# Altium footprint library Molex FFC - FPC Connectors (SMT).PcbLib: 638 footprints (part 8 of 40)
Each footprint in its own frame and in the unit in brackets; x right, y up, seen from the top. Pads: shape width x height; smd on the part's side, far side on the other; paste and mask are expansions set on the pad; w line width, h text height; cw(c..) or ccw(c..) is an arc to the next point about the centre after c.
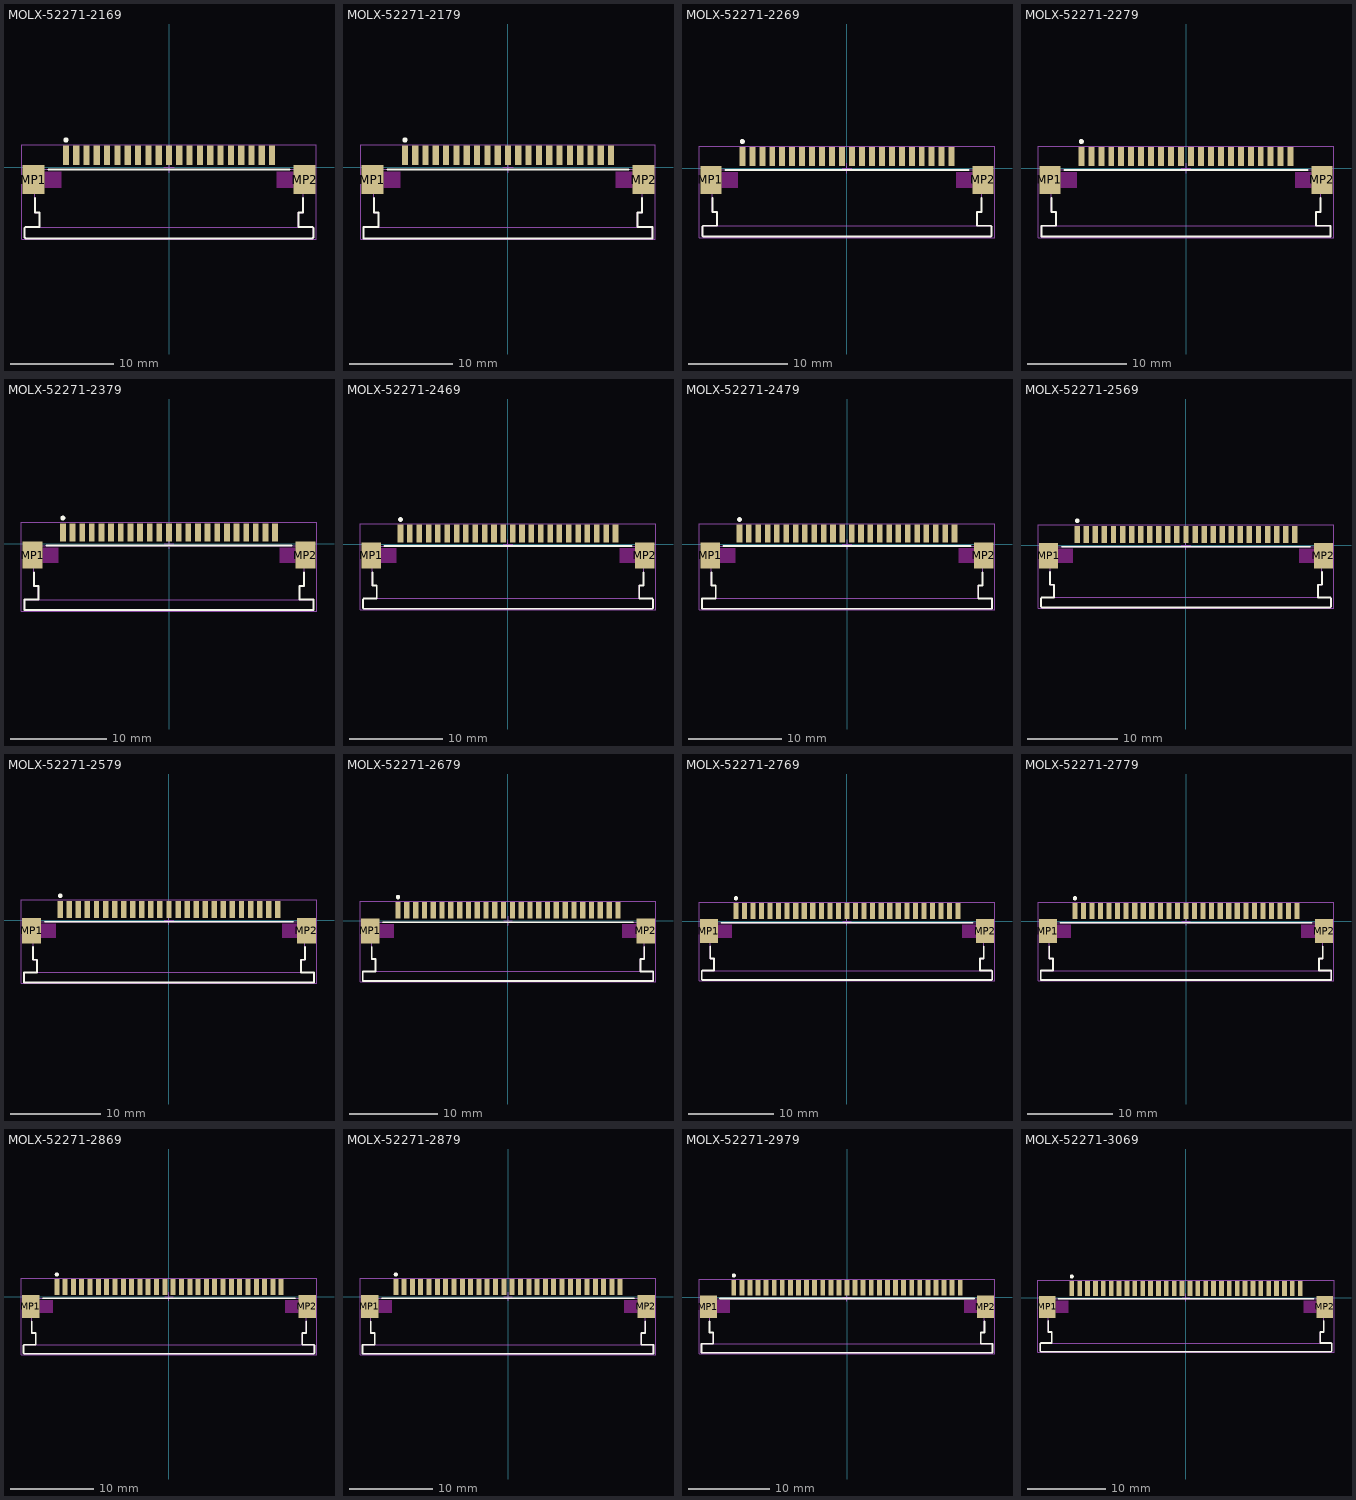
[diagram p7: the footprints below, top view; thin cyan lines are the x and y axes]

## MOLX-52271-2169 [mm] "FPC Connector, 21-Leads, Right Angle, Pitch 1.0 mm, Mated Height 3.0 mm, SMT"
height 3.012
pads (23):
  rect 0.6x1.9 smd: 1(-10,1.175) 2(-9,1.175) 3(-8,1.175) 4(-7,1.175) 5(-6,1.175) 6(-5,1.175) 7(-4,1.175) 8(-3,1.175) 9(-2,1.175) 10(-1,1.175) 11(0,1.175) 12(1,1.175) 13(2,1.175) 14(3,1.175) 15(4,1.175) 16(5,1.175) 17(6,1.175) 18(7,1.175) 19(8,1.175) 20(9,1.175) 21(10,1.175)
  rect 2.1x2.8 smd: MP1(-13.15,-1.175) MP2(13.15,-1.175)
Top Overlay:
  circle w0.25: c-10,2.675 r0.125
  lines w0.2: -13,-2.975 -13,-4.375 -12.55,-4.375 -12.55,-5.775 -13.912,-5.775 -14,-5.863 -14,-6.787 -13.912,-6.875 13.912,-6.875 14,-6.787 14,-5.863 13.912,-5.775 12.55,-5.775 12.55,-4.375 13,-4.375 13,-2.975 ; -11.7,-0.175 11.7,-0.175
Keep-Out Layer:
  rectangle: -12.1,-1.975 -10.45,-0.375
  rectangle: 10.45,-1.975 12.1,-0.375
Mechanical 13:
  lines w0.1: -12.55,-5.775 -12.55,-4.375 -13,-4.375 -13,-0.175 13,-0.175 13,-4.375 12.55,-4.375 12.55,-5.775 ; -14,-6.787 -14,-5.863 -13.912,-5.775 13.912,-5.775 14,-5.863 14,-6.787 13.912,-6.875 -13.912,-6.875 -14,-6.787
Mechanical 15:
  lines w0.05: -14.3,-6.975 14.3,-6.975 14.3,2.225 -14.3,2.225 -14.3,-6.975
  lines w0.1: -0.5,0 0.5,0 ; 0,-0.5 0,0.5
3D body: height 0.25, standoff 0, extent -14,-6.875 14,1.825

## MOLX-52271-2179 [mm] "FPC Connector, 21-Leads, Right Angle, Pitch 1.0 mm, Mated Height 3.0 mm, SMT"
height 3.012
pads (23):
  rect 0.6x1.9 smd: 1(-10,1.175) 2(-9,1.175) 3(-8,1.175) 4(-7,1.175) 5(-6,1.175) 6(-5,1.175) 7(-4,1.175) 8(-3,1.175) 9(-2,1.175) 10(-1,1.175) 11(0,1.175) 12(1,1.175) 13(2,1.175) 14(3,1.175) 15(4,1.175) 16(5,1.175) 17(6,1.175) 18(7,1.175) 19(8,1.175) 20(9,1.175) 21(10,1.175)
  rect 2.1x2.8 smd: MP1(-13.15,-1.175) MP2(13.15,-1.175)
Top Overlay:
  circle w0.25: c-10,2.675 r0.125
  lines w0.2: -13,-2.975 -13,-4.375 -12.55,-4.375 -12.55,-5.775 -14,-5.775 -14,-6.875 14,-6.875 14,-5.775 12.55,-5.775 12.55,-4.375 13,-4.375 13,-2.975 ; -11.7,-0.175 11.7,-0.175
Keep-Out Layer:
  rectangle: 10.45,-1.975 12.1,-0.375
  region: -10.45,-0.375 -12.1,-0.375 -12.1,-1.975 -10.45,-1.975
Mechanical 13:
  lines w0.1: -12.55,-5.775 -12.55,-4.375 -13,-4.375 -13,-0.175 13,-0.175 13,-4.375 12.55,-4.375 12.55,-5.775 ; -14,-6.875 -14,-5.775 14,-5.775 14,-6.875 -14,-6.875
Mechanical 15:
  lines w0.05: -14.3,-6.975 14.3,-6.975 14.3,2.225 -14.3,2.225 -14.3,-6.975
  lines w0.1: -0.5,0 0.5,0 ; 0,-0.5 0,0.5
3D body: height 0.25, standoff 0, extent -14,-6.875 14,1.825

## MOLX-52271-2269 [mm] "FPC Connector, 22-Leads, Right Angle, Pitch 1.0 mm, Mated Height 3.0 mm, SMT"
height 3.012
pads (24):
  rect 0.6x1.9 smd: 1(-10.5,1.175) 2(-9.5,1.175) 3(-8.5,1.175) 4(-7.5,1.175) 5(-6.5,1.175) 6(-5.5,1.175) 7(-4.5,1.175) 8(-3.5,1.175) 9(-2.5,1.175) 10(-1.5,1.175) 11(-0.5,1.175) 12(0.5,1.175) 13(1.5,1.175) 14(2.5,1.175) 15(3.5,1.175) 16(4.5,1.175) 17(5.5,1.175) 18(6.5,1.175) 19(7.5,1.175) 20(8.5,1.175) 21(9.5,1.175) 22(10.5,1.175)
  rect 2.1x2.8 smd: MP1(-13.65,-1.175) MP2(13.65,-1.175)
Top Overlay:
  circle w0.25: c-10.5,2.675 r0.125
  lines w0.2: -13.5,-2.975 -13.5,-4.375 -13.05,-4.375 -13.05,-5.775 -14.412,-5.775 -14.5,-5.863 -14.5,-6.787 -14.412,-6.875 14.412,-6.875 14.5,-6.787 14.5,-5.863 14.412,-5.775 13.05,-5.775 13.05,-4.375 13.5,-4.375 13.5,-2.975 ; -12.2,-0.175 12.2,-0.175
Keep-Out Layer:
  rectangle: -12.6,-1.975 -10.95,-0.375
  rectangle: 10.95,-1.975 12.6,-0.375
Mechanical 13:
  lines w0.1: -13.05,-5.775 -13.05,-4.375 -13.5,-4.375 -13.5,-0.175 13.5,-0.175 13.5,-4.375 13.05,-4.375 13.05,-5.775 ; -14.5,-6.787 -14.5,-5.863 -14.412,-5.775 14.412,-5.775 14.5,-5.863 14.5,-6.787 14.412,-6.875 -14.412,-6.875 -14.5,-6.787
Mechanical 15:
  lines w0.05: -14.8,-6.975 14.8,-6.975 14.8,2.225 -14.8,2.225 -14.8,-6.975
  lines w0.1: -0.5,0 0.5,0 ; 0,-0.5 0,0.5
3D body: height 0.25, standoff 0, extent -14.5,-6.875 14.5,1.825

## MOLX-52271-2279 [mm] "FPC Connector, 22-Leads, Right Angle, Pitch 1.0 mm, Mated Height 3.0 mm, SMT"
height 3.012
pads (24):
  rect 0.6x1.9 smd: 1(-10.5,1.175) 2(-9.5,1.175) 3(-8.5,1.175) 4(-7.5,1.175) 5(-6.5,1.175) 6(-5.5,1.175) 7(-4.5,1.175) 8(-3.5,1.175) 9(-2.5,1.175) 10(-1.5,1.175) 11(-0.5,1.175) 12(0.5,1.175) 13(1.5,1.175) 14(2.5,1.175) 15(3.5,1.175) 16(4.5,1.175) 17(5.5,1.175) 18(6.5,1.175) 19(7.5,1.175) 20(8.5,1.175) 21(9.5,1.175) 22(10.5,1.175)
  rect 2.1x2.8 smd: MP1(-13.65,-1.175) MP2(13.65,-1.175)
Top Overlay:
  circle w0.25: c-10.5,2.675 r0.125
  lines w0.2: -13.5,-2.975 -13.5,-4.375 -13.05,-4.375 -13.05,-5.775 -14.5,-5.775 -14.5,-6.875 14.5,-6.875 14.5,-5.775 13.05,-5.775 13.05,-4.375 13.5,-4.375 13.5,-2.975 ; -12.2,-0.175 12.2,-0.175
Keep-Out Layer:
  region: -10.95,-0.375 -12.6,-0.375 -12.6,-1.975 -10.95,-1.975
  rectangle: 10.95,-1.975 12.6,-0.375
Mechanical 13:
  lines w0.1: -13.05,-5.775 -13.05,-4.375 -13.5,-4.375 -13.5,-0.175 13.5,-0.175 13.5,-4.375 13.05,-4.375 13.05,-5.775 ; -14.5,-6.875 14.5,-6.875 14.5,-5.775 -14.5,-5.775 -14.5,-6.875
Mechanical 15:
  lines w0.05: -14.8,-6.975 -14.8,2.225 14.8,2.225 14.8,-6.975 -14.8,-6.975
  lines w0.1: -0.5,0 0.5,0 ; 0,-0.5 0,0.5
3D body: height 0.25, standoff 0, extent -14.5,-6.875 14.5,1.825

## MOLX-52271-2379 [mm] "FPC Connector, 23-Leads, Right Angle, Pitch 1.0 mm, Mated Height 3.0 mm, SMT"
height 3.012
pads (25):
  rect 0.6x1.9 smd: 1(-11,1.175) 2(-10,1.175) 3(-9,1.175) 4(-8,1.175) 5(-7,1.175) 6(-6,1.175) 7(-5,1.175) 8(-4,1.175) 9(-3,1.175) 10(-2,1.175) 11(-1,1.175) 12(0,1.175) 13(1,1.175) 14(2,1.175) 15(3,1.175) 16(4,1.175) 17(5,1.175) 18(6,1.175) 19(7,1.175) 20(8,1.175) 21(9,1.175) 22(10,1.175) 23(11,1.175)
  rect 2.1x2.8 smd: MP1(-14.15,-1.175) MP2(14.15,-1.175)
Top Overlay:
  circle w0.25: c-11,2.675 r0.125
  lines w0.2: -14,-2.975 -14,-4.375 -13.55,-4.375 -13.55,-5.775 -15,-5.775 -15,-6.875 15,-6.875 15,-5.775 13.55,-5.775 13.55,-4.375 14,-4.375 14,-2.975 ; -12.7,-0.175 12.7,-0.175
Keep-Out Layer:
  region: -11.45,-0.375 -13.1,-0.375 -13.1,-1.975 -11.45,-1.975
  rectangle: 11.45,-1.975 13.1,-0.375
Mechanical 13:
  lines w0.1: -13.55,-5.775 -13.55,-4.375 -14,-4.375 -14,-0.175 14,-0.175 14,-4.375 13.55,-4.375 13.55,-5.775 ; -15,-6.875 15,-6.875 15,-5.775 -15,-5.775 -15,-6.875
Mechanical 15:
  lines w0.05: -15.3,-6.975 -15.3,2.225 15.3,2.225 15.3,-6.975 -15.3,-6.975
  lines w0.1: -0.5,0 0.5,0 ; 0,-0.5 0,0.5
3D body: height 0.25, standoff 0, extent -15,-6.875 15,1.825

## MOLX-52271-2469 [mm] "FPC Connector, 24-Leads, Right Angle, Pitch 1.0 mm, Mated Height 3.0 mm, SMT"
height 3.012
pads (26):
  rect 0.6x1.9 smd: 1(-11.5,1.175) 2(-10.5,1.175) 3(-9.5,1.175) 4(-8.5,1.175) 5(-7.5,1.175) 6(-6.5,1.175) 7(-5.5,1.175) 8(-4.5,1.175) 9(-3.5,1.175) 10(-2.5,1.175) 11(-1.5,1.175) 12(-0.5,1.175) 13(0.5,1.175) 14(1.5,1.175) 15(2.5,1.175) 16(3.5,1.175) 17(4.5,1.175) 18(5.5,1.175) 19(6.5,1.175) 20(7.5,1.175) 21(8.5,1.175) 22(9.5,1.175) 23(10.5,1.175) 24(11.5,1.175)
  rect 2.1x2.8 smd: MP1(-14.65,-1.175) MP2(14.65,-1.175)
Top Overlay:
  circle w0.25: c-11.5,2.675 r0.125
  lines w0.2: -14.5,-2.975 -14.5,-4.375 -14.05,-4.375 -14.05,-5.775 -15.412,-5.775 -15.5,-5.863 -15.5,-6.787 -15.412,-6.875 15.412,-6.875 15.5,-6.787 15.5,-5.863 15.412,-5.775 14.05,-5.775 14.05,-4.375 14.5,-4.375 14.5,-2.975 ; -13.2,-0.175 13.2,-0.175
Keep-Out Layer:
  rectangle: 11.95,-1.975 13.6,-0.375
  rectangle: -13.6,-1.975 -11.95,-0.375
Mechanical 13:
  lines w0.1: -14.05,-5.775 -14.05,-4.375 -14.5,-4.375 -14.5,-0.175 14.5,-0.175 14.5,-4.375 14.05,-4.375 14.05,-5.775 ; -15.5,-6.787 -15.412,-6.875 15.412,-6.875 15.5,-6.787 15.5,-5.863 15.412,-5.775 -15.412,-5.775 -15.5,-5.863 -15.5,-6.787
Mechanical 15:
  lines w0.05: -15.8,-6.975 -15.8,2.225 15.8,2.225 15.8,-6.975 -15.8,-6.975
  lines w0.1: -0.5,0 0.5,0 ; 0,-0.5 0,0.5
3D body: height 0.25, standoff 0, extent -15.5,-6.875 15.5,1.825

## MOLX-52271-2479 [mm] "FPC Connector, 24-Leads, Right Angle, Pitch 1.0 mm, Mated Height 3.0 mm, SMT"
height 3.012
pads (26):
  rect 0.6x1.9 smd: 1(-11.5,1.175) 2(-10.5,1.175) 3(-9.5,1.175) 4(-8.5,1.175) 5(-7.5,1.175) 6(-6.5,1.175) 7(-5.5,1.175) 8(-4.5,1.175) 9(-3.5,1.175) 10(-2.5,1.175) 11(-1.5,1.175) 12(-0.5,1.175) 13(0.5,1.175) 14(1.5,1.175) 15(2.5,1.175) 16(3.5,1.175) 17(4.5,1.175) 18(5.5,1.175) 19(6.5,1.175) 20(7.5,1.175) 21(8.5,1.175) 22(9.5,1.175) 23(10.5,1.175) 24(11.5,1.175)
  rect 2.1x2.8 smd: MP1(-14.65,-1.175) MP2(14.65,-1.175)
Top Overlay:
  circle w0.25: c-11.5,2.675 r0.125
  lines w0.2: -14.5,-2.975 -14.5,-4.375 -14.05,-4.375 -14.05,-5.775 -15.5,-5.775 -15.5,-6.875 15.5,-6.875 15.5,-5.775 14.05,-5.775 14.05,-4.375 14.5,-4.375 14.5,-2.975 ; -13.2,-0.175 13.2,-0.175
Keep-Out Layer:
  region: -11.95,-0.375 -13.6,-0.375 -13.6,-1.975 -11.95,-1.975
  rectangle: 11.95,-1.975 13.6,-0.375
Mechanical 13:
  lines w0.1: -14.05,-5.775 -14.05,-4.375 -14.5,-4.375 -14.5,-0.175 14.5,-0.175 14.5,-4.375 14.05,-4.375 14.05,-5.775 ; -15.5,-6.875 15.5,-6.875 15.5,-5.775 -15.5,-5.775 -15.5,-6.875
Mechanical 15:
  lines w0.05: -15.8,-6.975 -15.8,2.225 15.8,2.225 15.8,-6.975 -15.8,-6.975
  lines w0.1: -0.5,0 0.5,0 ; 0,-0.5 0,0.5
3D body: height 0.25, standoff 0, extent -15.5,-6.875 15.5,1.825

## MOLX-52271-2569 [mm] "FPC Connector, 25-Leads, Right Angle, Pitch 1.0 mm, Mated Height 3.0 mm, SMT"
height 3.012
pads (27):
  rect 0.6x1.9 smd: 1(-12,1.175) 2(-11,1.175) 3(-10,1.175) 4(-9,1.175) 5(-8,1.175) 6(-7,1.175) 7(-6,1.175) 8(-5,1.175) 9(-4,1.175) 10(-3,1.175) 11(-2,1.175) 12(-1,1.175) 13(0,1.175) 14(1,1.175) 15(2,1.175) 16(3,1.175) 17(4,1.175) 18(5,1.175) 19(6,1.175) 20(7,1.175) 21(8,1.175) 22(9,1.175) 23(10,1.175) 24(11,1.175) 25(12,1.175)
  rect 2.1x2.8 smd: MP1(-15.15,-1.175) MP2(15.15,-1.175)
Top Overlay:
  circle w0.25: c-12,2.675 r0.125
  lines w0.2: -15,-2.975 -15,-4.375 -14.55,-4.375 -14.55,-5.775 -15.912,-5.775 -16,-5.863 -16,-6.787 -15.912,-6.875 15.912,-6.875 16,-6.787 16,-5.863 15.912,-5.775 14.55,-5.775 14.55,-4.375 15,-4.375 15,-2.975 ; -13.7,-0.175 13.7,-0.175
Keep-Out Layer:
  rectangle: -14.1,-1.975 -12.45,-0.375
  rectangle: 12.45,-1.975 14.1,-0.375
Mechanical 13:
  lines w0.1: -14.55,-5.775 -14.55,-4.375 -15,-4.375 -15,-0.175 15,-0.175 15,-4.375 14.55,-4.375 14.55,-5.775 ; -16,-6.787 -16,-5.863 -15.912,-5.775 15.912,-5.775 16,-5.863 16,-6.787 15.912,-6.875 -15.912,-6.875 -16,-6.787
Mechanical 15:
  lines w0.05: -16.3,-6.975 16.3,-6.975 16.3,2.225 -16.3,2.225 -16.3,-6.975
  lines w0.1: -0.5,0 0.5,0 ; 0,-0.5 0,0.5
3D body: height 0.25, standoff 0, extent -16,-6.875 16,1.825

## MOLX-52271-2579 [mm] "FPC Connector, 25-Leads, Right Angle, Pitch 1.0 mm, Mated Height 3.0 mm, SMT"
height 3.012
pads (27):
  rect 0.6x1.9 smd: 1(-12,1.175) 2(-11,1.175) 3(-10,1.175) 4(-9,1.175) 5(-8,1.175) 6(-7,1.175) 7(-6,1.175) 8(-5,1.175) 9(-4,1.175) 10(-3,1.175) 11(-2,1.175) 12(-1,1.175) 13(0,1.175) 14(1,1.175) 15(2,1.175) 16(3,1.175) 17(4,1.175) 18(5,1.175) 19(6,1.175) 20(7,1.175) 21(8,1.175) 22(9,1.175) 23(10,1.175) 24(11,1.175) 25(12,1.175)
  rect 2.1x2.8 smd: MP1(-15.15,-1.175) MP2(15.15,-1.175)
Top Overlay:
  circle w0.25: c-12,2.675 r0.125
  lines w0.2: -15,-2.975 -15,-4.375 -14.55,-4.375 -14.55,-5.775 -16,-5.775 -16,-6.875 16,-6.875 16,-5.775 14.55,-5.775 14.55,-4.375 15,-4.375 15,-2.975 ; -13.7,-0.175 13.7,-0.175
Keep-Out Layer:
  region: -12.45,-0.375 -14.1,-0.375 -14.1,-1.975 -12.45,-1.975
  rectangle: 12.45,-1.975 14.1,-0.375
Mechanical 13:
  lines w0.1: -14.55,-5.775 -14.55,-4.375 -15,-4.375 -15,-0.175 15,-0.175 15,-4.375 14.55,-4.375 14.55,-5.775 ; -16,-6.875 16,-6.875 16,-5.775 -16,-5.775 -16,-6.875
Mechanical 15:
  lines w0.05: -16.3,-6.975 -16.3,2.225 16.3,2.225 16.3,-6.975 -16.3,-6.975
  lines w0.1: -0.5,0 0.5,0 ; 0,-0.5 0,0.5
3D body: height 0.25, standoff 0, extent -16,-6.875 16,1.825

## MOLX-52271-2679 [mm] "FPC Connector, 26-Leads, Right Angle, Pitch 1.0 mm, Mated Height 3.0 mm, SMT"
height 3.012
pads (28):
  rect 0.6x1.9 smd: 1(-12.5,1.175) 2(-11.5,1.175) 3(-10.5,1.175) 4(-9.5,1.175) 5(-8.5,1.175) 6(-7.5,1.175) 7(-6.5,1.175) 8(-5.5,1.175) 9(-4.5,1.175) 10(-3.5,1.175) 11(-2.5,1.175) 12(-1.5,1.175) 13(-0.5,1.175) 14(0.5,1.175) 15(1.5,1.175) 16(2.5,1.175) 17(3.5,1.175) 18(4.5,1.175) 19(5.5,1.175) 20(6.5,1.175) 21(7.5,1.175) 22(8.5,1.175) 23(9.5,1.175) 24(10.5,1.175) 25(11.5,1.175) 26(12.5,1.175)
  rect 2.1x2.8 smd: MP1(-15.65,-1.175) MP2(15.65,-1.175)
Top Overlay:
  circle w0.25: c-12.5,2.675 r0.125
  lines w0.2: -15.5,-2.975 -15.5,-4.375 -15.05,-4.375 -15.05,-5.775 -16.5,-5.775 -16.5,-6.875 16.5,-6.875 16.5,-5.775 15.05,-5.775 15.05,-4.375 15.5,-4.375 15.5,-2.975 ; -14.2,-0.175 14.2,-0.175
Keep-Out Layer:
  region: -12.95,-0.375 -14.6,-0.375 -14.6,-1.975 -12.95,-1.975
  rectangle: 12.95,-1.975 14.6,-0.375
Mechanical 13:
  lines w0.1: -15.05,-5.775 -15.05,-4.375 -15.5,-4.375 -15.5,-0.175 15.5,-0.175 15.5,-4.375 15.05,-4.375 15.05,-5.775 ; -16.5,-6.875 -16.5,-5.775 16.5,-5.775 16.5,-6.875 -16.5,-6.875
Mechanical 15:
  lines w0.05: -16.8,-6.975 16.8,-6.975 16.8,2.225 -16.8,2.225 -16.8,-6.975
  lines w0.1: -0.5,0 0.5,0 ; 0,-0.5 0,0.5
3D body: height 0.25, standoff 0, extent -16.5,-6.875 16.5,1.825

## MOLX-52271-2769 [mm] "FPC Connector, 27-Leads, Right Angle, Pitch 1.0 mm, Mated Height 3.0 mm, SMT"
height 3.012
pads (29):
  rect 0.6x1.9 smd: 1(-13,1.175) 2(-12,1.175) 3(-11,1.175) 4(-10,1.175) 5(-9,1.175) 6(-8,1.175) 7(-7,1.175) 8(-6,1.175) 9(-5,1.175) 10(-4,1.175) 11(-3,1.175) 12(-2,1.175) 13(-1,1.175) 14(0,1.175) 15(1,1.175) 16(2,1.175) 17(3,1.175) 18(4,1.175) 19(5,1.175) 20(6,1.175) 21(7,1.175) 22(8,1.175) 23(9,1.175) 24(10,1.175) 25(11,1.175) 26(12,1.175) 27(13,1.175)
  rect 2.1x2.8 smd: MP1(-16.15,-1.175) MP2(16.15,-1.175)
Top Overlay:
  circle w0.25: c-13,2.675 r0.125
  lines w0.2: -16,-2.975 -16,-4.375 -15.55,-4.375 -15.55,-5.775 -16.912,-5.775 -17,-5.863 -17,-6.787 -16.912,-6.875 16.912,-6.875 17,-6.787 17,-5.863 16.912,-5.775 15.55,-5.775 15.55,-4.375 16,-4.375 16,-2.975 ; -14.7,-0.175 14.7,-0.175
Keep-Out Layer:
  rectangle: -15.1,-1.975 -13.45,-0.375
  rectangle: 13.45,-1.975 15.1,-0.375
Mechanical 13:
  lines w0.1: -15.55,-5.775 -15.55,-4.375 -16,-4.375 -16,-0.175 16,-0.175 16,-4.375 15.55,-4.375 15.55,-5.775 ; -17,-6.787 -17,-5.863 -16.912,-5.775 16.912,-5.775 17,-5.863 17,-6.787 16.912,-6.875 -16.912,-6.875 -17,-6.787
Mechanical 15:
  lines w0.05: -17.3,-6.975 17.3,-6.975 17.3,2.225 -17.3,2.225 -17.3,-6.975
  lines w0.1: -0.5,0 0.5,0 ; 0,-0.5 0,0.5
3D body: height 0.25, standoff 0, extent -17,-6.875 17,1.825

## MOLX-52271-2779 [mm] "FPC Connector, 27-Leads, Right Angle, Pitch 1.0 mm, Mated Height 3.0 mm, SMT"
height 3.012
pads (29):
  rect 0.6x1.9 smd: 1(-13,1.175) 2(-12,1.175) 3(-11,1.175) 4(-10,1.175) 5(-9,1.175) 6(-8,1.175) 7(-7,1.175) 8(-6,1.175) 9(-5,1.175) 10(-4,1.175) 11(-3,1.175) 12(-2,1.175) 13(-1,1.175) 14(0,1.175) 15(1,1.175) 16(2,1.175) 17(3,1.175) 18(4,1.175) 19(5,1.175) 20(6,1.175) 21(7,1.175) 22(8,1.175) 23(9,1.175) 24(10,1.175) 25(11,1.175) 26(12,1.175) 27(13,1.175)
  rect 2.1x2.8 smd: MP1(-16.15,-1.175) MP2(16.15,-1.175)
Top Overlay:
  circle w0.25: c-13,2.675 r0.125
  lines w0.2: -16,-2.975 -16,-4.375 -15.55,-4.375 -15.55,-5.775 -17,-5.775 -17,-6.875 17,-6.875 17,-5.775 15.55,-5.775 15.55,-4.375 16,-4.375 16,-2.975 ; -14.7,-0.175 14.7,-0.175
Keep-Out Layer:
  region: -13.45,-0.375 -15.1,-0.375 -15.1,-1.975 -13.45,-1.975
  rectangle: 13.45,-1.975 15.1,-0.375
Mechanical 13:
  lines w0.1: -15.55,-5.775 -15.55,-4.375 -16,-4.375 -16,-0.175 16,-0.175 16,-4.375 15.55,-4.375 15.55,-5.775 ; -17,-6.875 17,-6.875 17,-5.775 -17,-5.775 -17,-6.875
Mechanical 15:
  lines w0.05: -17.3,-6.975 -17.3,2.225 17.3,2.225 17.3,-6.975 -17.3,-6.975
  lines w0.1: -0.5,0 0.5,0 ; 0,-0.5 0,0.5
3D body: height 0.25, standoff 0, extent -17,-6.875 17,1.825

## MOLX-52271-2869 [mm] "FPC Connector, 28-Leads, Right Angle, Pitch 1.0 mm, Mated Height 3.0 mm, SMT"
height 3.012
pads (30):
  rect 0.6x1.9 smd: 1(-13.5,1.175) 2(-12.5,1.175) 3(-11.5,1.175) 4(-10.5,1.175) 5(-9.5,1.175) 6(-8.5,1.175) 7(-7.5,1.175) 8(-6.5,1.175) 9(-5.5,1.175) 10(-4.5,1.175) 11(-3.5,1.175) 12(-2.5,1.175) 13(-1.5,1.175) 14(-0.5,1.175) 15(0.5,1.175) 16(1.5,1.175) 17(2.5,1.175) 18(3.5,1.175) 19(4.5,1.175) 20(5.5,1.175) 21(6.5,1.175) 22(7.5,1.175) 23(8.5,1.175) 24(9.5,1.175) 25(10.5,1.175) 26(11.5,1.175) 27(12.5,1.175) 28(13.5,1.175)
  rect 2.1x2.8 smd: MP1(-16.65,-1.175) MP2(16.65,-1.175)
Top Overlay:
  circle w0.25: c-13.5,2.675 r0.125
  lines w0.2: -16.5,-2.975 -16.5,-4.375 -16.05,-4.375 -16.05,-5.775 -17.412,-5.775 -17.5,-5.863 -17.5,-6.787 -17.412,-6.875 17.412,-6.875 17.5,-6.787 17.5,-5.863 17.412,-5.775 16.05,-5.775 16.05,-4.375 16.5,-4.375 16.5,-2.975 ; -15.2,-0.175 15.2,-0.175
Keep-Out Layer:
  rectangle: -15.6,-1.975 -13.95,-0.375
  rectangle: 13.95,-1.975 15.6,-0.375
Mechanical 13:
  lines w0.1: -16.05,-5.775 -16.05,-4.375 -16.5,-4.375 -16.5,-0.175 16.5,-0.175 16.5,-4.375 16.05,-4.375 16.05,-5.775 ; -17.5,-6.787 -17.5,-5.863 -17.412,-5.775 17.412,-5.775 17.5,-5.863 17.5,-6.787 17.412,-6.875 -17.412,-6.875 -17.5,-6.787
Mechanical 15:
  lines w0.05: -17.8,-6.975 17.8,-6.975 17.8,2.225 -17.8,2.225 -17.8,-6.975
  lines w0.1: -0.5,0 0.5,0 ; 0,-0.5 0,0.5
3D body: height 0.25, standoff 0, extent -17.5,-6.875 17.5,1.825

## MOLX-52271-2879 [mm] "FPC Connector, 28-Leads, Right Angle, Pitch 1.0 mm, Mated Height 3.0 mm, SMT"
height 3.012
pads (30):
  rect 0.6x1.9 smd: 1(-13.5,1.175) 2(-12.5,1.175) 3(-11.5,1.175) 4(-10.5,1.175) 5(-9.5,1.175) 6(-8.5,1.175) 7(-7.5,1.175) 8(-6.5,1.175) 9(-5.5,1.175) 10(-4.5,1.175) 11(-3.5,1.175) 12(-2.5,1.175) 13(-1.5,1.175) 14(-0.5,1.175) 15(0.5,1.175) 16(1.5,1.175) 17(2.5,1.175) 18(3.5,1.175) 19(4.5,1.175) 20(5.5,1.175) 21(6.5,1.175) 22(7.5,1.175) 23(8.5,1.175) 24(9.5,1.175) 25(10.5,1.175) 26(11.5,1.175) 27(12.5,1.175) 28(13.5,1.175)
  rect 2.1x2.8 smd: MP1(-16.65,-1.175) MP2(16.65,-1.175)
Top Overlay:
  circle w0.25: c-13.5,2.675 r0.125
  lines w0.2: -16.5,-2.975 -16.5,-4.375 -16.05,-4.375 -16.05,-5.775 -17.5,-5.775 -17.5,-6.875 17.5,-6.875 17.5,-5.775 16.05,-5.775 16.05,-4.375 16.5,-4.375 16.5,-2.975 ; -15.2,-0.175 15.2,-0.175
Keep-Out Layer:
  region: -13.95,-0.375 -15.6,-0.375 -15.6,-1.975 -13.95,-1.975
  rectangle: 13.95,-1.975 15.6,-0.375
Mechanical 13:
  lines w0.1: -16.05,-5.775 -16.05,-4.375 -16.5,-4.375 -16.5,-0.175 16.5,-0.175 16.5,-4.375 16.05,-4.375 16.05,-5.775 ; -17.5,-6.875 17.5,-6.875 17.5,-5.775 -17.5,-5.775 -17.5,-6.875
Mechanical 15:
  lines w0.05: -17.8,-6.975 -17.8,2.225 17.8,2.225 17.8,-6.975 -17.8,-6.975
  lines w0.1: -0.5,0 0.5,0 ; 0,-0.5 0,0.5
3D body: height 0.25, standoff 0, extent -17.5,-6.875 17.5,1.825

## MOLX-52271-2979 [mm] "FPC Connector, 29-Leads, Right Angle, Pitch 1.0 mm, Mated Height 3.0 mm, SMT"
height 3.012
pads (31):
  rect 0.6x1.9 smd: 1(-14,1.175) 2(-13,1.175) 3(-12,1.175) 4(-11,1.175) 5(-10,1.175) 6(-9,1.175) 7(-8,1.175) 8(-7,1.175) 9(-6,1.175) 10(-5,1.175) 11(-4,1.175) 12(-3,1.175) 13(-2,1.175) 14(-1,1.175) 15(0,1.175) 16(1,1.175) 17(2,1.175) 18(3,1.175) 19(4,1.175) 20(5,1.175) 21(6,1.175) 22(7,1.175) 23(8,1.175) 24(9,1.175) 25(10,1.175) 26(11,1.175) 27(12,1.175) 28(13,1.175) 29(14,1.175)
  rect 2.1x2.8 smd: MP1(-17.15,-1.175) MP2(17.15,-1.175)
Top Overlay:
  circle w0.25: c-14,2.675 r0.125
  lines w0.2: -17,-2.975 -17,-4.375 -16.55,-4.375 -16.55,-5.775 -18,-5.775 -18,-6.875 18,-6.875 18,-5.775 16.55,-5.775 16.55,-4.375 17,-4.375 17,-2.975 ; -15.7,-0.175 15.7,-0.175
Keep-Out Layer:
  region: -14.45,-0.375 -16.1,-0.375 -16.1,-1.975 -14.45,-1.975
  rectangle: 14.45,-1.975 16.1,-0.375
Mechanical 13:
  lines w0.1: -16.55,-5.775 -16.55,-4.375 -17,-4.375 -17,-0.175 17,-0.175 17,-4.375 ; 16.55,-4.375 17,-4.375 ; 16.55,-4.375 16.55,-5.775 16.55,-4.375 ; 16.55,-4.375 17,-4.375 ; 18,-6.875 18,-5.775 ; 18,-6.875 -18,-6.875 -18,-5.775 18,-5.775 ; 18,-6.875 18,-5.775
Mechanical 15:
  lines w0.05: -18.3,-6.975 -18.3,2.225 18.3,2.225 18.3,-6.975 -18.3,-6.975
  lines w0.1: -0.5,0 0.5,0 ; 0,-0.5 0,0.5
3D body: height 0.25, standoff 0, extent -18,-6.875 18,1.825

## MOLX-52271-3069 [mm] "FPC Connector, 30-Leads, Right Angle, Pitch 1.0 mm, Mated Height 3.0 mm, SMT"
height 3.012
pads (32):
  rect 0.6x1.9 smd: 1(-14.5,1.175) 2(-13.5,1.175) 3(-12.5,1.175) 4(-11.5,1.175) 5(-10.5,1.175) 6(-9.5,1.175) 7(-8.5,1.175) 8(-7.5,1.175) 9(-6.5,1.175) 10(-5.5,1.175) 11(-4.5,1.175) 12(-3.5,1.175) 13(-2.5,1.175) 14(-1.5,1.175) 15(-0.5,1.175) 16(0.5,1.175) 17(1.5,1.175) 18(2.5,1.175) 19(3.5,1.175) 20(4.5,1.175) 21(5.5,1.175) 22(6.5,1.175) 23(7.5,1.175) 24(8.5,1.175) 25(9.5,1.175) 26(10.5,1.175) 27(11.5,1.175) 28(12.5,1.175) 29(13.5,1.175) 30(14.5,1.175)
  rect 2.1x2.8 smd: MP1(-17.65,-1.175) MP2(17.65,-1.175)
Top Overlay:
  circle w0.25: c-14.5,2.675 r0.125
  lines w0.2: -17.5,-2.975 -17.5,-4.375 -17.05,-4.375 -17.05,-5.775 -18.412,-5.775 -18.5,-5.863 -18.5,-6.787 -18.412,-6.875 18.412,-6.875 18.5,-6.787 18.5,-5.863 18.412,-5.775 17.05,-5.775 17.05,-4.375 17.5,-4.375 17.5,-2.975 ; -16.2,-0.175 16.2,-0.175
Keep-Out Layer:
  rectangle: -16.6,-1.975 -14.95,-0.375
  rectangle: 14.95,-1.975 16.6,-0.375
Mechanical 13:
  lines w0.1: -17.05,-5.775 -17.05,-4.375 -17.5,-4.375 -17.5,-0.175 17.5,-0.175 17.5,-4.375 17.05,-4.375 17.05,-5.775 ; -18.5,-6.787 -18.5,-5.863 -18.412,-5.775 18.412,-5.775 18.5,-5.863 18.5,-6.787 18.412,-6.875 -18.412,-6.875 -18.5,-6.787
Mechanical 15:
  lines w0.05: -18.8,-6.975 18.8,-6.975 18.8,2.225 -18.8,2.225 -18.8,-6.975
  lines w0.1: -0.5,0 0.5,0 ; 0,-0.5 0,0.5
3D body: height 0.25, standoff 0, extent -18.5,-6.875 18.5,1.825